# Altium footprint library Miscellaneous THD.PcbLib: 216 footprints (part 4 of 15)
Each footprint in its own frame and in the unit in brackets; x right, y up, seen from the top. Pads: shape width x height; smd on the part's side, far side on the other; paste and mask are expansions set on the pad; w line width, h text height; cw(c..) or ccw(c..) is an arc to the next point about the centre after c.
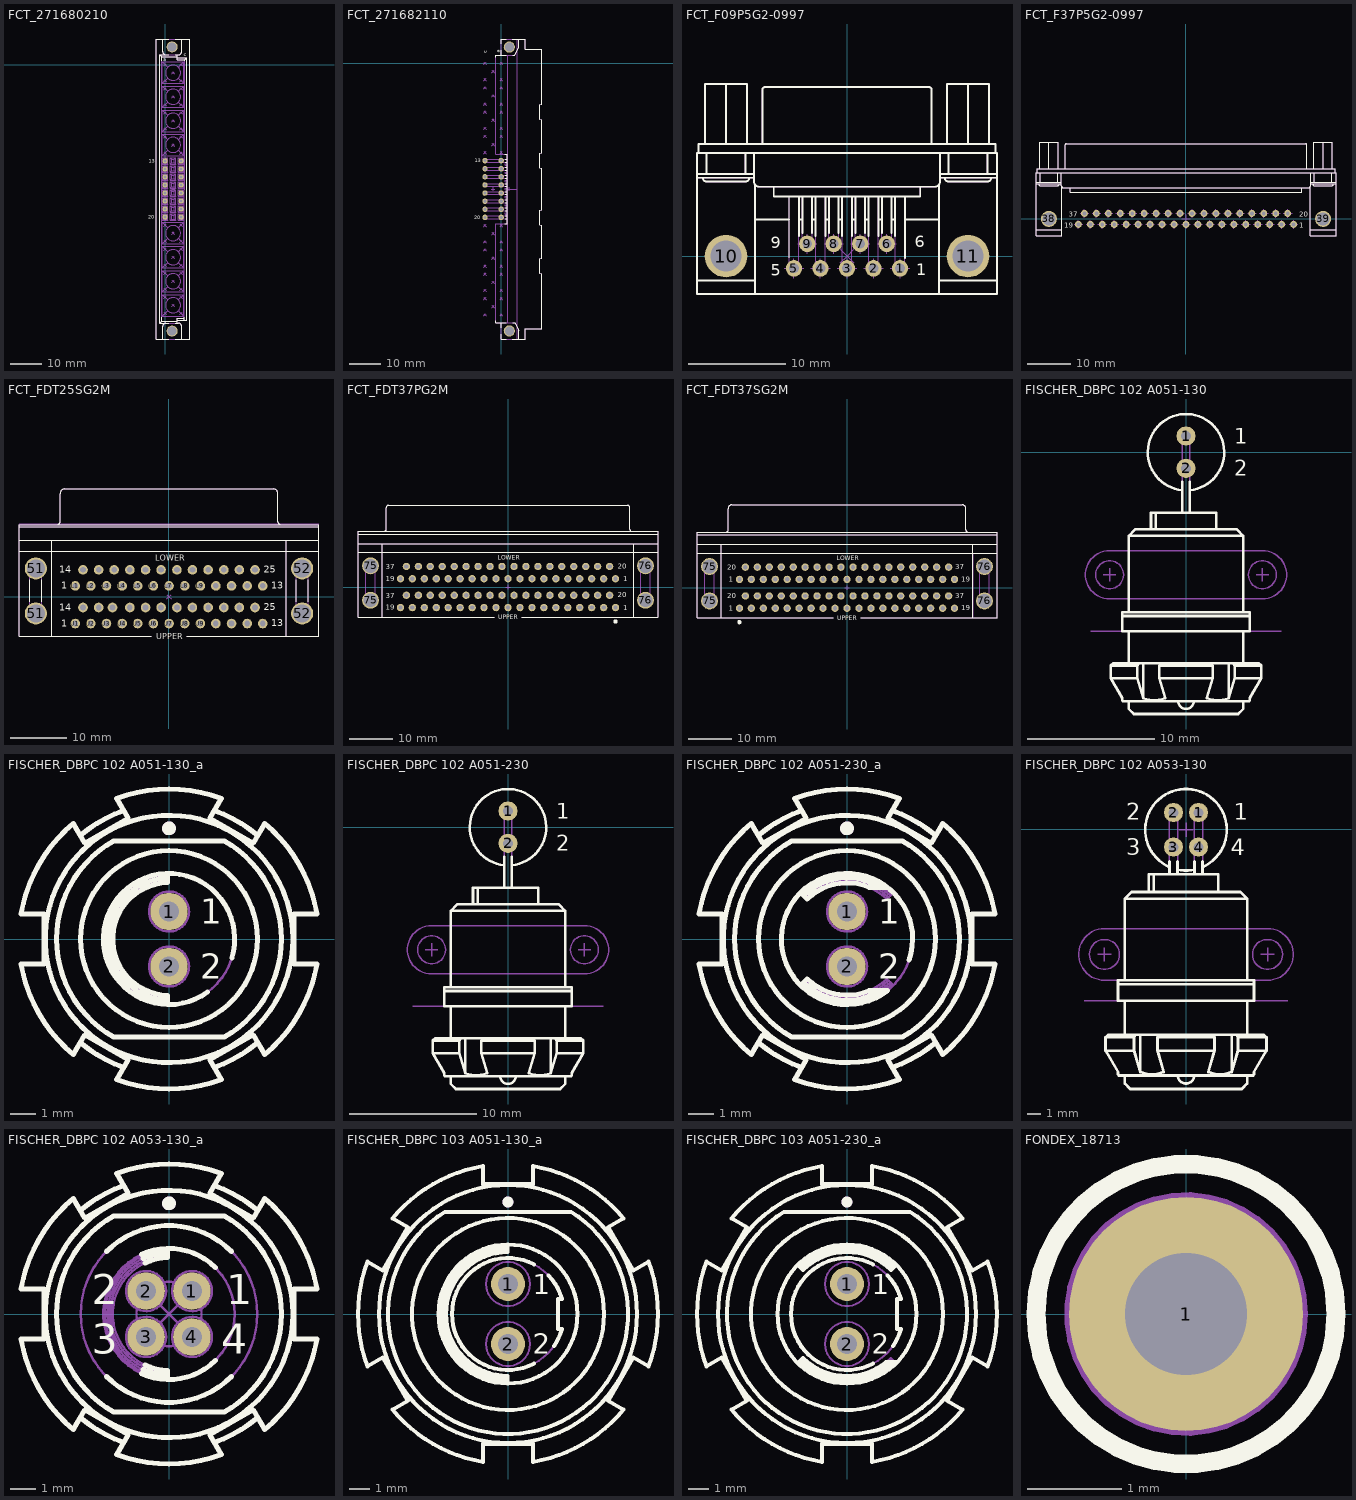
[diagram p3: the footprints below, top view; thin cyan lines are the x and y axes]

## FCT_271680210 [mm] "DIN 41612, Type M, 16 Contacts (Row ac) + 8 Spares  Positions for Specials Contacts, Straight Female Connector, Pitch 2.54 mm"
height 12.6
pads (18):
  round 1.7 hole 1: a13(0,-30.48) a14(0,-33.02) a15(0,-35.56) a16(0,-38.1) a17(0,-40.64) a18(0,-43.18) a19(0,-45.72) a20(0,-48.26) c13(5.08,-30.48) c14(5.08,-33.02) c15(5.08,-35.56) c16(5.08,-38.1) c17(5.08,-40.64) c18(5.08,-43.18) c19(5.08,-45.72) c20(5.08,-48.26)
  round 3.5 / inner round 3.5 / far side round 5.1 hole 2.8: MTG1(2.24,5.63) MTG2(2.24,-84.37)
Top Overlay:
  lines w0.2: -1.651,-81.811 -1.11,-81.27 ; -1.651,3.071 -1.11,2.53 ; -1.11,-79.99 -1.11,-81.27 ; -1.11,1.25 -1.11,2.53 ; -0.76,-86.866 -0.76,-82.87 cw(c0.24,-82.87) 0.24,-81.87 1.22,-81.87 -1.71,-81.87 -1.71,3.13 1.22,3.13 0.24,3.13 cw(c0.24,4.13) -0.76,4.13 -0.76,8.13 ; 1.22,-86.87 -2.76,-86.87 -2.76,8.13 1.22,8.13 ; 3.26,-86.87 7.84,-86.87 7.84,8.13 3.26,8.13 ; 3.79,-81.27 -1.11,-81.27 ; 3.79,2.53 -1.11,2.53 ; 5.24,-86.863 5.24,-82.87 ccw(c4.24,-82.87) 4.24,-81.87 3.26,-81.87 3.79,-81.87 3.79,-80.87 ; 5.24,8.13 5.24,4.13 cw(c4.24,4.13) 4.24,3.13 3.26,3.13 3.79,3.13 3.79,2.13 ; 6.04,-80.87 6.042,-79.99 ; 6.04,-80.27 3.79,-80.27 3.79,-80.87 ; 6.189,1.25 6.19,1.53 ; 6.731,2.071 6.19,1.53 ; 3.79,-80.87 6.79,-80.87 6.79,2.13 3.79,2.13 ; 3.79,2.13 3.79,1.53 6.19,1.53
  text "20" at -5.345,-48.8 h1.2
  text "13" at -5.14,-31.055 h1.2
  text "c" at 5.88,2.71 h1.2
  text "a" at -0.526,1.135 h1.2
Mechanical 8:
  drawing of 236 lines, arcs and shapes, not listed
Mechanical 14:
  drawing of 395 lines, arcs and shapes, not listed
3D body "FCT_271680210.stp": height 13.05, standoff -3.55, extent -2.76,-86.87 7.84,8.13

## FCT_271682110 [mm] "DIN 41612, Type M, 16 Contacts (Row ac) + 8 Spares  Positions for Specials Contacts, Right Angle Male Connector, Pitch 2.54 mm"
height 11.1
pads (18):
  round 1.7 hole 1: a13(0,-30.48) a14(0,-33.02) a15(0,-35.56) a16(0,-38.1) a17(0,-40.64) a18(0,-43.18) a19(0,-45.72) a20(0,-48.26) c13(-5.08,-30.48) c14(-5.08,-33.02) c15(-5.08,-35.56) c16(-5.08,-38.1) c17(-5.08,-40.64) c18(-5.08,-43.18) c19(-5.08,-45.72) c20(-5.08,-48.26)
  round 3.5 / inner round 3.5 / far side round 5.1 hole 2.8: MTG1(2.54,5.08) MTG2(2.54,-83.82)
Top Overlay:
  lines w0.2: -1.76,-80.59 -1.76,-81.32 0.04,-81.32 ; -1.76,1.85 -1.76,2.58 0.04,2.58 ; 0.04,-84.84 0.04,-86.37 1.653,-86.37 ; 0.04,-82.8 0.04,-81.32 ; 0.04,4.06 0.04,2.58 ; 0.04,6.1 0.04,7.63 1.653,7.63 ; 1.175,-50.29 1.84,-50.29 1.84,-28.45 1.175,-28.45 ; 1.25,-48.71 1.84,-48.71 ; 1.25,-47.81 1.84,-47.81 ; 1.25,-46.17 1.84,-46.17 ; 1.25,-45.27 1.84,-45.27 ; 1.25,-43.63 1.84,-43.63 ; 1.25,-42.73 1.84,-42.73 ; 1.25,-41.09 1.84,-41.09 ; 1.25,-40.19 1.84,-40.19 ; 1.25,-38.55 1.84,-38.55 ; 1.25,-37.65 1.84,-37.65 ; 1.25,-36.01 1.84,-36.01 ; 1.25,-35.11 1.84,-35.11 ; 1.25,-33.47 1.84,-33.47 ; 1.25,-32.57 1.84,-32.57 ; 1.25,-30.93 1.84,-30.93 ; 1.25,-30.03 1.84,-30.03 ; 1.52,-81.32 0.04,-81.32 ; 1.52,2.58 0.04,2.58 ; 3.427,-86.37 7.54,-86.37 7.54,-83.12 12.74,-83.12 12.74,-65.961 12.14,-65.8 12.14,-61.2 12.74,-61.039 12.74,-50.721 12.14,-50.56 12.14,-45.96 12.74,-45.799 12.74,-32.941 12.14,-32.78 12.14,-28.18 12.74,-28.019 12.74,-17.701 12.14,-17.54 12.14,-12.94 12.74,-12.779 12.74,4.38 7.54,4.38 7.54,7.63 3.427,7.63 ; 3.56,-81.32 4.214,-81.32 5.54,-83.616 5.54,-86.37 ; 3.56,2.58 4.214,2.58 5.54,4.876 5.54,7.63
  text "c" at -4.58,3.22 h1.2
  text "a" at -0.425,3.252 h1.2
  text "13" at -8.27,-31.055 h1.2
  text "20" at -8.475,-48.8 h1.2
Mechanical 8:
  drawing of 241 lines, arcs and shapes, not listed
  text "PCB" at 6.585,-41.2 h1.2
Mechanical 14:
  circle w0.1: c2.54,-83.82 r1.275
  circle w0.1: c2.54,5.08 r1.275
  lines w0.1: 1.84,-48.71 -5.38,-48.71 -5.38,-47.81 1.84,-47.81 ; 1.84,-47.213 1.34,-47.213 1.34,-46.767 1.84,-46.767 ; 1.84,-46.17 -5.38,-46.17 -5.38,-45.27 1.84,-45.27 ; 1.84,-44.673 1.34,-44.673 1.34,-44.227 1.84,-44.227 ; 1.84,-43.63 -5.38,-43.63 -5.38,-42.73 1.84,-42.73 ; 1.84,-42.133 1.34,-42.133 1.34,-41.687 1.84,-41.687 ; 1.84,-41.09 -5.38,-41.09 -5.38,-40.19 1.84,-40.19 ; 1.84,-39.593 1.34,-39.593 1.34,-39.147 1.84,-39.147 ; 1.84,-38.55 -5.38,-38.55 -5.38,-37.65 1.84,-37.65 ; 1.84,-37.053 1.34,-37.053 1.34,-36.607 1.84,-36.607 ; 1.84,-36.01 -5.38,-36.01 -5.38,-35.11 1.84,-35.11 ; 1.84,-34.513 1.34,-34.513 1.34,-34.067 1.84,-34.067 ; 1.84,-33.47 -5.38,-33.47 -5.38,-32.57 1.84,-32.57 ; 1.84,-31.973 1.34,-31.973 1.34,-31.527 1.84,-31.527 ; 1.84,-30.93 -5.38,-30.93 -5.38,-30.03 1.84,-30.03 ; 2.04,-81.32 2.04,2.58 ; 5.54,-86.37 5.54,-83.616 4.214,-81.32 0.04,-81.32 ; 5.54,7.63 5.54,4.876 4.214,2.58 0.04,2.58 ; 0.04,-81.32 0.04,-86.37 7.54,-86.37 7.54,-83.12 12.74,-83.12 12.74,-65.961 12.14,-65.8 12.14,-61.2 12.74,-61.039 12.74,-50.721 12.14,-50.56 12.14,-45.96 12.74,-45.799 12.74,-32.941 12.14,-32.78 12.14,-28.18 12.74,-28.019 12.74,-17.701 12.14,-17.54 12.14,-12.94 12.74,-12.779 12.74,4.38 7.54,4.38 7.54,7.63 0.04,7.63 0.04,2.58 ; 0.04,-81.32 -1.76,-81.32 -1.76,-50.29 1.84,-50.29 1.84,-28.45 -1.76,-28.45 -1.76,2.58 0.04,2.58
3D body "FCT_271682110.stp": height 9.38, standoff -2.95, extent -5.38,-86.37 12.74,7.63

## FCT_F09P5G2-0997 [mm] "Right Angled D-SUB 9 Male Contacts for PCB  with Female Screwlock (UNC4-40) and Grounding Bracket  and Snap-in Rivet"
height 13.4
pads (11):
  round 1.7 hole 1: 1(5.48,-1.27) 2(2.74,-1.27) 3(0,-1.27) 4(-2.74,-1.27) 5(-5.48,-1.27) 6(4.11,1.27) 7(1.37,1.27) 8(-1.37,1.27) 9(-4.11,1.27)
  round 4.4 hole 3.2: 10(-12.5,0) 11(12.5,0)
Top Overlay:
  lines w0.1: -5.98,-0.179 -5.98,6.17
  lines w0.2: -15.5,-2.5 -9.5,-2.5 ; -15.5,8.1 -9.6,8.1 ; -15.5,8.5 -9.6,8.5 ; -15.35,10.67 -15.35,11.57 15.35,11.57 15.35,10.67 ; -14.9,8.1 ccw(c-14.5,8.1) -14.5,7.7 -10.5,7.7 ccw(c-10.5,8.1) -10.1,8.1 ; -14.665,11.57 -14.665,17.77 -10.335,17.77 -10.335,11.57 ; -14.504,8.5 -14.504,10.67 ; -12.5,11.6 -12.5,17.77 ; -10.5,8.5 -10.5,10.67 ; -9.6,10.67 -9.6,7.67 ccw(c-9.1,7.67) -9.1,7.17 9.1,7.17 ccw(c9.1,7.67) 9.6,7.67 9.6,10.67 ; -9.5,3.8 -5.98,3.8 ; -9.5,7.37 -9.5,-3.9 ; -8.751,11.57 -8.751,17.17 cw(c-8.451,17.17) -8.451,17.47 8.452,17.47 cw(c8.452,17.17) 8.752,17.17 8.752,11.57 ; -7.569,7.17 -7.569,6.17 7.57,6.17 7.57,7.17 ; -4.98,2.096 -4.98,6.17 ; -4.98,3.8 -4.606,3.8 ; -4.608,2.362 -4.603,6.17 ; -3.61,2.361 -3.61,6.17 ; -3.61,3.8 -3.24,3.8 ; -3.24,2.096 -3.24,6.17 ; -2.24,2.096 -2.24,6.17 ; -2.24,3.8 -1.866,3.8 ; -1.868,2.362 -1.863,6.17 ; -0.87,2.361 -0.87,6.17 ; -0.87,3.8 -0.5,3.8 ; -0.5,2.096 -0.5,6.17 ; 0.5,2.096 0.5,6.17 ; 0.5,3.8 0.874,3.8 ; 0.872,2.362 0.877,6.17 ; 1.87,2.361 1.87,6.17 ; 1.87,3.8 2.24,3.8 ; 2.24,2.096 2.24,6.17 ; 3.24,2.096 3.24,6.17 ; 3.24,3.8 3.614,3.8 ; 3.612,2.362 3.617,6.17 ; 4.61,2.361 4.61,6.17 ; 4.61,3.8 4.98,3.8 ; 4.98,2.096 4.98,6.17 ; 5.98,-0.179 5.98,6.17 ; 5.98,3.8 9.5,3.8 ; 9.5,-2.5 15.5,-2.5 ; 9.5,7.37 9.5,-3.9 ; 9.6,8.1 15.5,8.1 ; 9.6,8.5 15.5,8.5 ; 10.1,8.1 ccw(c10.5,8.1) 10.5,7.7 14.5,7.7 ccw(c14.5,8.1) 14.9,8.1 ; 10.335,11.57 10.335,17.77 14.665,17.77 14.665,11.57 ; 10.5,8.5 10.5,10.67 ; 12.5,11.6 12.5,17.77 ; 14.504,8.5 14.504,10.67 ; -15.5,10.67 15.5,10.67 ; -15.5,10.67 15.5,10.67 ; -15.5,10.67 -15.5,-3.9 -9.5,-3.9 ; -9.5,-3.9 9.5,-3.9 ; 9.5,-3.9 15.5,-3.9 15.5,10.67
  text "9" at -7.857,0.8 h1.2
  text "5" at -7.857,-2.007 h1.2
  text "1" at 7.141,-1.982 h1.2
  text "6" at 7,0.9 h1.2
Mechanical 8:
  lines w0.1: -13.5,0 -12.5,0 ; -12.5,-1 -12.5,0 ; -12.5,1 -12.5,0 ; -11.5,0 -12.5,0 ; -6.48,-1.27 -5.48,-1.27 ; -5.48,-2.27 -5.48,-1.27 ; -5.48,-0.27 -5.48,-1.27 ; -5.11,1.27 -4.11,1.27 ; -4.48,-1.27 -5.48,-1.27 ; -4.11,0.27 -4.11,1.27 ; -4.11,2.27 -4.11,1.27 ; -3.74,-1.27 -2.74,-1.27 ; -3.11,1.27 -4.11,1.27 ; -2.74,-2.27 -2.74,-1.27 ; -2.74,-0.27 -2.74,-1.27 ; -2.37,1.27 -1.37,1.27 ; -1.74,-1.27 -2.74,-1.27 ; -1.37,0.27 -1.37,1.27 ; -1.37,2.27 -1.37,1.27 ; -1,-1.27 0,-1.27 ; -0.707,-0.707 0,0 ; -0.707,0.707 0,0 ; -0.37,1.27 -1.37,1.27 ; 0,-2.27 0,-1.27 ; 0,-0.27 0,-1.27 ; 0.37,1.27 1.37,1.27 ; 0.707,-0.707 0,0 ; 0.707,0.707 0,0 ; 1,-1.27 0,-1.27 ; 1.37,0.27 1.37,1.27 ; 1.37,2.27 1.37,1.27 ; 1.74,-1.27 2.74,-1.27 ; 2.37,1.27 1.37,1.27 ; 2.74,-2.27 2.74,-1.27 ; 2.74,-0.27 2.74,-1.27 ; 3.11,1.27 4.11,1.27 ; 3.74,-1.27 2.74,-1.27 ; 4.11,0.27 4.11,1.27 ; 4.11,2.27 4.11,1.27 ; 4.48,-1.27 5.48,-1.27 ; 5.11,1.27 4.11,1.27 ; 5.48,-2.27 5.48,-1.27 ; 5.48,-0.27 5.48,-1.27 ; 6.48,-1.27 5.48,-1.27 ; 11.5,0 12.5,0 ; 12.5,-1 12.5,0 ; 12.5,1 12.5,0 ; 13.5,0 12.5,0
Mechanical 14:
  circle w0.1: c12.5,0 r1.55
  circle w0.1: c-12.5,0 r1.55
  lines w0.1: -15.5,-2.5 -9.5,-2.5 ; -15.5,8.1 -9.6,8.1 ; -15.5,8.5 -9.6,8.5 ; -15.35,10.67 -15.35,11.57 15.35,11.57 15.35,10.67 ; -14.9,8.1 ccw(c-14.5,8.1) -14.5,7.7 -10.5,7.7 ccw(c-10.5,8.1) -10.1,8.1 ; -14.665,11.57 -14.665,17.77 -10.335,17.77 -10.335,11.57 ; -14.504,8.5 -14.504,10.67 ; -12.5,11.6 -12.5,17.77 ; -10.5,8.5 -10.5,10.67 ; -9.6,10.67 -9.6,7.67 ccw(c-9.1,7.67) -9.1,7.17 9.1,7.17 ccw(c9.1,7.67) 9.6,7.67 9.6,10.67 ; -9.5,3.8 -5.98,3.8 ; -9.5,7.37 -9.5,-3.9 ; -8.751,11.57 -8.751,17.17 cw(c-8.451,17.17) -8.451,17.47 8.452,17.47 cw(c8.452,17.17) 8.752,17.17 8.752,11.57 ; -7.569,7.17 -7.569,6.17 7.57,6.17 7.57,7.17 ; -5.98,6.17 -5.98,-1.27 ccw(c-5.48,-1.27) -4.98,-1.27 -4.98,6.17 ; -4.98,3.8 -4.606,3.8 ; -4.61,1.27 ccw(c-4.11,1.27) -3.61,1.27 -3.61,6.17 ; -4.61,1.271 -4.603,6.17 ; -3.61,3.8 -3.24,3.8 ; -3.24,6.17 -3.24,-1.27 ccw(c-2.74,-1.27) -2.24,-1.27 -2.24,6.17 ; -2.24,3.8 -1.866,3.8 ; -1.87,1.27 ccw(c-1.37,1.27) -0.87,1.27 -0.87,6.17 ; -1.87,1.271 -1.863,6.17 ; -0.87,3.8 -0.5,3.8 ; -0.5,6.17 -0.5,-1.27 ccw(c0,-1.27) 0.5,-1.27 0.5,6.17 ; 0.5,3.8 0.874,3.8 ; 0.87,1.27 ccw(c1.37,1.27) 1.87,1.27 1.87,6.17 ; 0.87,1.271 0.877,6.17 ; 1.87,3.8 2.24,3.8 ; 2.24,6.17 2.24,-1.27 ccw(c2.74,-1.27) 3.24,-1.27 3.24,6.17 ; 3.24,3.8 3.614,3.8 ; 3.61,1.27 ccw(c4.11,1.27) 4.61,1.27 4.61,6.17 ; 3.61,1.271 3.617,6.17 ; 4.61,3.8 4.98,3.8 ; 4.98,6.17 4.98,-1.27 ccw(c5.48,-1.27) 5.98,-1.27 5.98,6.17 ; 5.98,3.8 9.5,3.8 ; 9.5,-2.5 15.5,-2.5 ; 9.5,7.37 9.5,-3.9 ; 9.6,8.1 15.5,8.1 ; 9.6,8.5 15.5,8.5 ; 10.1,8.1 ccw(c10.5,8.1) 10.5,7.7 14.5,7.7 ccw(c14.5,8.1) 14.9,8.1 ; 10.335,11.57 10.335,17.77 14.665,17.77 14.665,11.57 ; 10.5,8.5 10.5,10.67 ; 12.5,11.6 12.5,17.77 ; 14.504,8.5 14.504,10.67 ; -15.5,10.67 15.5,10.67 ; -15.5,10.67 15.5,10.67 ; -15.5,10.67 -15.5,-3.9 -9.5,-3.9 ; -9.5,-3.9 9.5,-3.9 ; 9.5,-3.9 15.5,-3.9 15.5,10.67
3D body "FCT_F09P5G2-0997.stp": height 13.45, standoff -4.2, extent -15.5,-3.9 15.5,17.77

## FCT_F37P5G2-0997 [mm] "Right Angled D-SUB 37 Male Contacts for PCB  with Harpoons and Female Screwlock (UNC4-40) and Elec. Continuity"
height 13.4
pads (39):
  round 1.6 hole 0.9: 1(24.93,-1.27) 2(22.16,-1.27) 3(19.39,-1.27) 4(16.62,-1.27) 5(13.85,-1.27) 6(11.08,-1.27) 7(8.31,-1.27) 8(5.54,-1.27) 9(2.77,-1.27) 10(0,-1.27) 11(-2.77,-1.27) 12(-5.54,-1.27) 13(-8.31,-1.27) 14(-11.08,-1.27) 15(-13.85,-1.27) 16(-16.62,-1.27) 17(-19.39,-1.27) 18(-22.16,-1.27) 19(-24.93,-1.27) 20(23.56,1.27) 21(20.79,1.27) 22(18.02,1.27) 23(15.25,1.27) 24(12.48,1.27) 25(9.71,1.27) 26(6.94,1.27) 27(4.17,1.27) 28(1.4,1.27) 29(-1.37,1.27) 30(-4.14,1.27) 31(-6.91,1.27) 32(-9.68,1.27) 33(-12.45,1.27) 34(-15.22,1.27) 35(-17.99,1.27) 36(-20.76,1.27) 37(-23.53,1.27)
  round 3.7 hole 3: 38(-31.75,0) 39(31.75,0)
Top Overlay:
  lines w0.2: -34.75,-2.5 -28.75,-2.5 ; -34.75,8.1 -28.85,8.1 ; -34.75,8.5 -28.85,8.5 ; -34.6,10.67 -34.6,11.57 34.6,11.57 34.6,10.67 ; -34.15,8.1 ccw(c-33.75,8.1) -33.75,7.7 -29.75,7.7 ccw(c-29.75,8.1) -29.35,8.1 ; -33.915,11.57 -33.915,17.77 -29.585,17.77 -29.585,11.57 ; -33.754,8.5 -33.754,10.67 ; -31.75,11.6 -31.75,17.77 ; -29.75,8.5 -29.75,10.67 ; -28.85,10.67 -28.85,7.67 ccw(c-28.35,7.67) -28.35,7.17 ; -28.75,7.37 -28.75,-3.9 -34.75,-3.9 -34.75,10.67 ; -28.65,7.17 28.35,7.17 ccw(c28.35,7.67) 28.85,7.67 28.85,10.67 ; -28.001,11.57 -28.001,17.17 cw(c-27.701,17.17) -27.701,17.47 27.702,17.47 cw(c27.702,17.17) 28.002,17.17 28.002,11.57 ; -26.819,7.17 -26.819,6.17 26.82,6.17 26.82,7.17 ; 28.75,-2.5 34.75,-2.5 ; 28.75,7.37 28.75,-3.9 34.75,-3.9 34.75,10.67 ; 28.85,8.1 34.75,8.1 ; 28.85,8.5 34.75,8.5 ; 29.35,8.1 ccw(c29.75,8.1) 29.75,7.7 33.75,7.7 ccw(c33.75,8.1) 34.15,8.1 ; 29.585,11.57 29.585,17.77 33.915,17.77 33.915,11.57 ; 29.75,8.5 29.75,10.67 ; 31.75,11.6 31.75,17.77 ; 33.754,8.5 33.754,10.67 ; -34.75,10.67 34.75,10.67 ; -34.75,10.67 34.75,10.67
  text "20" at 26.181,0.508 h1.2
  text "1" at 26.181,-2.032 h1.2
  text "19" at -28.21,-2 h1.2
  text "37" at -27.197,0.508 h1.2
Mechanical 8:
  drawing of 164 lines, arcs and shapes, not listed
Mechanical 14:
  circle w0.1: c31.75,0 r1.55
  circle w0.1: c-31.75,0 r1.55
  lines w0.1: -34.75,-2.5 -28.75,-2.5 ; -34.75,8.1 -28.85,8.1 ; -34.75,8.5 -28.85,8.5 ; -34.6,10.67 -34.6,11.57 34.6,11.57 34.6,10.67 ; -34.15,8.1 ccw(c-33.75,8.1) -33.75,7.7 -29.75,7.7 ccw(c-29.75,8.1) -29.35,8.1 ; -33.915,11.57 -33.915,17.77 -29.585,17.77 -29.585,11.57 ; -33.754,8.5 -33.754,10.67 ; -31.75,11.6 -31.75,17.77 ; -29.75,8.5 -29.75,10.67 ; -28.85,10.67 -28.85,7.67 ccw(c-28.35,7.67) -28.35,7.17 ; -28.75,7.37 -28.75,-3.9 -34.75,-3.9 -34.75,10.67 ; -28.65,7.17 28.35,7.17 ccw(c28.35,7.67) 28.85,7.67 28.85,10.67 ; -28.001,11.57 -28.001,17.17 cw(c-27.701,17.17) -27.701,17.47 27.702,17.47 cw(c27.702,17.17) 28.002,17.17 28.002,11.57 ; -26.819,7.17 -26.819,6.17 26.82,6.17 26.82,7.17 ; 28.75,-2.5 34.75,-2.5 ; 28.75,7.37 28.75,-3.9 34.75,-3.9 34.75,10.67 ; 28.85,8.1 34.75,8.1 ; 28.85,8.5 34.75,8.5 ; 29.35,8.1 ccw(c29.75,8.1) 29.75,7.7 33.75,7.7 ccw(c33.75,8.1) 34.15,8.1 ; 29.585,11.57 29.585,17.77 33.915,17.77 33.915,11.57 ; 29.75,8.5 29.75,10.67 ; 31.75,11.6 31.75,17.77 ; 33.754,8.5 33.754,10.67 ; -34.75,10.67 34.75,10.67 ; -34.75,10.67 34.75,10.67
3D body "FCT_37P5G2-0997.stp": height 13.45, standoff -4.2, extent -34.75,-3.9 34.75,17.77

## FCT_FDT25SG2M [mm] "Dual Stacked  Right Angled D-SUB 25 Pins Female Connector, With Threaded Insert UNC 4-40, And PCB Mount Retention"
height 31.65
pads (54):
  round 3.9 hole 3.2: 51(-23.52,-2.96) 51(-23.52,4.99) 52(23.52,-2.96) 52(23.52,4.99)
  round 1.7 hole 1: L1(-16.56,1.91) L2(-13.82,1.91) L3(-11.05,1.91) L4(-8.28,1.91) L5(-5.54,1.91) L6(-2.77,1.91) L7(0,1.91) L8(2.77,1.91) L9(5.54,1.91) L10(8.28,1.91) L11(11.05,1.91) L12(13.82,1.91) L13(16.56,1.91) L14(-15.19,4.75) L15(-12.42,4.75) L16(-9.68,4.75) L17(-6.91,4.75) L18(-4.14,4.75) L19(-1.4,4.75) L20(1.4,4.75) L21(4.14,4.75) L22(6.91,4.75) L23(9.68,4.75) L24(12.42,4.75) L25(15.19,4.75) U1(-16.56,-4.75) U2(-13.82,-4.75) U3(-11.05,-4.75) U4(-8.28,-4.75) U5(-5.54,-4.75) U6(-2.77,-4.75) U7(0,-4.75) U8(2.77,-4.75) U9(5.54,-4.75) U10(8.28,-4.75) U11(11.05,-4.75) U12(13.82,-4.75) U13(16.56,-4.75) U14(-15.19,-1.91) U15(-12.42,-1.91) U16(-9.98,-1.91) U17(-6.91,-1.91) U18(-4.14,-1.91) U19(-1.4,-1.91) U20(1.4,-1.91) U21(4.14,-1.91) U22(6.91,-1.91) U23(9.68,-1.91) U24(12.42,-1.91) U25(15.19,-1.91)
Top Overlay:
  lines w0.2: -26.5,7.99 26.5,7.99 ; -26.5,9.99 26.5,9.99 ; -26.475,12.34 26.5,12.34 ; -24.586,-0.922 -24.586,2.952 ; -22.454,-0.922 -22.454,2.952 ; -20.72,-6.96 -20.72,9.99 ; -3.15,-6.96 -26.5,-6.96 -26.5,12.74 -19.75,12.74 ; 3.15,-6.96 26.5,-6.96 26.5,12.74 19.75,12.74 ; 20.72,-6.96 20.735,9.99 ; 22.454,-0.922 22.454,2.952 ; 24.586,-0.922 24.586,2.952 ; -19.75,12.74 ccw(c-19.75,13.24) -19.25,13.24 -19.25,18.178 cw(c-18.4,18.178) -18.4,19.028 18.4,19.028 cw(c18.4,18.178) 19.25,18.178 19.25,13.24 ccw(c19.75,13.24) 19.75,12.74 ; -19.75,12.74 19.75,12.74
  text "25" at 16.736,4.238 h1.2
  text "25" at 16.736,-2.422 h1.2
  text "13" at 18.106,-5.262 h1.2
  text "13" at 18.106,1.398 h1.2
  text "UPPER" at -2.21,-7.485 h1
  text "LOWER" at -2.425,6.335 h1
  text "1" at -19.069,-5.287 h1.2
  text "1" at -19.069,1.373 h1.2
  text "14" at -19.346,4.188 h1.2
  text "14" at -19.346,-2.472 h1.2
Mechanical 8:
  drawing of 222 lines, arcs and shapes, not listed
Mechanical 14:
  lines w0.1: -26.5,7.99 26.5,7.99 ; -26.5,9.99 26.5,9.99 ; -26.475,12.34 26.5,12.34 ; -20.72,-6.96 -20.72,9.99 ; -3.15,-6.96 -26.5,-6.96 -26.5,12.74 -19.75,12.74 ; 3.15,-6.96 26.5,-6.96 26.5,12.74 19.75,12.74 ; 20.72,-6.96 20.735,9.99 ; -19.75,12.74 ccw(c-19.75,13.24) -19.25,13.24 -19.25,18.178 cw(c-18.4,18.178) -18.4,19.028 18.4,19.028 cw(c18.4,18.178) 19.25,18.178 19.25,13.24 ccw(c19.75,13.24) 19.75,12.74 ; -19.75,12.74 19.75,12.74 ; -24.586,-3.26 -24.586,5.09 -22.454,5.09 -22.454,-3.26 -24.586,-3.26 ; 22.454,-3.26 24.586,-3.26 24.586,5.09 22.454,5.09 22.454,-3.26
  text "25" at 16.736,4.238 h1.2
  text "25" at 16.736,-2.422 h1.2
  text "13" at 18.106,-5.262 h1.2
  text "13" at 18.106,1.398 h1.2
  text "UPPER" at -2.21,-7.485 h1
  text "LOWER" at -2.425,6.335 h1
  text "1" at -19.069,-5.287 h1.2
  text "1" at -19.069,1.373 h1.2
  text "14" at -19.346,4.188 h1.2
  text "14" at -19.346,-2.472 h1.2
3D body "FCT_FDT25SG2M.stp": height 31.7, standoff -3.5, extent -26.5,-6.96 26.5,19.028

## FCT_FDT37PG2M [mm] "Dual Stacked  Right Angled D-SUB 37 Pins Male Connector, With Threaded Insert UNC 4-40, And PCB Mount Retention"
height 31.5
pads (78):
  round 3.9 hole 3.2: 75(-31.75,-3.06) 75(-31.75,4.89) 76(31.75,-3.06) 76(31.75,4.89)
  round 1.7 hole 1: L1(24.84,1.91) L2(22.1,1.91) L3(19.33,1.91) L4(16.56,1.91) L5(13.82,1.91) L6(11.05,1.91) L7(8.28,1.91) L8(5.54,1.91) L9(2.773,1.91) L10(0,1.91) L11(-2.77,1.91) L12(-5.54,1.91) L13(-8.28,1.91) L14(-11.05,1.91) L15(-13.82,1.91) L16(-16.56,1.91) L17(-19.33,1.91) L18(-22.1,1.91) L19(-24.84,1.91) L20(23.47,4.75) L21(20.7,4.75) L22(17.96,4.75) L23(15.19,4.75) L24(12.42,4.75) L25(9.68,4.75) L26(6.91,4.75) L27(4.14,4.75) L28(1.4,4.75) L29(-1.4,4.75) L30(-4.14,4.75) L31(-6.91,4.75) L32(-9.68,4.75) L33(-12.42,4.75) L34(-15.19,4.75) L35(-17.96,4.75) L36(-20.7,4.75) L37(-23.47,4.75) U1(24.84,-4.75) U2(22.1,-4.75) U3(19.33,-4.75) U4(16.56,-4.75) U5(13.82,-4.75) U6(11.05,-4.75) U7(8.28,-4.75) U8(5.54,-4.75) U9(2.773,-4.75) U10(0,-4.75) U11(-2.77,-4.75) U12(-5.54,-4.75) U13(-8.28,-4.75) U14(-11.05,-4.75) U15(-13.82,-4.75) U16(-16.56,-4.75) U17(-19.33,-4.75) U18(-22.1,-4.75) U19(-24.84,-4.75) U20(23.47,-1.91) U21(20.7,-1.91) U22(17.96,-1.91) U23(15.19,-1.91) U24(12.42,-1.91) U25(9.68,-1.91) U26(6.91,-1.91) U27(4.14,-1.91) U28(1.4,-1.91) U29(-1.4,-1.91) U30(-4.14,-1.91) U31(-6.91,-1.91) U32(-9.68,-1.91) U33(-12.42,-1.91) U34(-15.19,-1.91) U35(-17.96,-1.91) U36(-20.7,-1.91) U37(-23.47,-1.91)
Top Overlay:
  circle w0.5: c24.835,-7.955 r0.25
  lines w0.2: -34.65,-6.96 -3.14,-6.96 ; -34.65,-6.96 -34.65,12.84 34.65,12.84 34.65,-6.96 3.14,-6.96 ; -34.65,9.99 34.65,9.99 ; -34.65,12.24 34.65,12.24 ; -34.55,7.99 34.55,7.99 ; -29.05,-6.96 -29.05,7.99 -29.05,9.99 ; -28.65,12.84 ccw(c-28.65,13.34) -28.15,13.34 -28.15,18.34 cw(c-27.65,18.34) -27.65,18.84 27.649,18.84 cw(c27.649,18.34) 28.149,18.34 28.149,13.34 ccw(c28.649,13.34) 28.649,12.84 ; 29.05,-6.96 29.05,6.99 29.05,9.99
  text "UPPER" at -2.21,-7.485 h1
  text "LOWER" at -2.425,6.335 h1
  text "1" at 26.596,-5.352 h1.2
  text "1" at 26.596,1.308 h1.2
  text "20" at 25.369,4.253 h1.2
  text "20" at 25.369,-2.407 h1.2
  text "19" at -28.244,-5.287 h1.2
  text "19" at -28.244,1.373 h1.2
  text "37" at -28.204,4.113 h1.2
  text "37" at -28.204,-2.547 h1.2
Mechanical 8:
  drawing of 320 lines, arcs and shapes, not listed
Mechanical 14:
  lines w0.1: -34.65,-6.96 -34.65,12.84 34.65,12.84 34.65,-6.96 3.14,-6.96 ; -34.65,9.99 34.65,9.99 ; -34.65,12.24 34.65,12.24 ; -34.55,7.99 34.55,7.99 ; -29.05,-6.96 -29.05,7.99 -29.05,9.99 ; -28.65,12.84 ccw(c-28.65,13.34) -28.15,13.34 -28.15,18.34 cw(c-27.65,18.34) -27.65,18.84 27.649,18.84 cw(c27.649,18.34) 28.149,18.34 28.149,13.34 ccw(c28.649,13.34) 28.649,12.84 ; 29.05,-6.96 29.05,6.99 29.05,9.99 ; 30.684,5.09 30.684,-3.26 32.816,-3.26 32.816,5.09 ; 30.72,5.09 32.828,5.09 ; -34.65,-6.96 -3.14,-6.96 -34.65,-6.96 ; -32.816,-3.26 -32.816,5.09 -30.684,5.09 -30.684,-3.26 -32.816,-3.26
  text "UPPER" at -2.21,-7.485 h1
  text "LOWER" at -2.425,6.335 h1
  text "1" at 26.596,-5.352 h1.2
  text "1" at 26.596,1.308 h1.2
  text "20" at 25.369,4.253 h1.2
  text "20" at 25.369,-2.407 h1.2
  text "19" at -28.244,-5.287 h1.2
  text "19" at -28.244,1.373 h1.2
  text "37" at -28.204,4.113 h1.2
  text "37" at -28.204,-2.547 h1.2
3D body "FCT_FDT37PG2M.stp": height 31.7, standoff -3.5, extent -34.65,-6.96 34.65,18.84
